# Altium footprint library CPU_STM_080816.PcbLib: 220 footprints (part 7 of 16)
Each footprint in its own frame and in the unit in brackets; x right, y up, seen from the top. Pads: shape width x height; smd on the part's side, far side on the other; paste and mask are expansions set on the pad; w line width, h text height; cw(c..) or ccw(c..) is an arc to the next point about the centre after c.
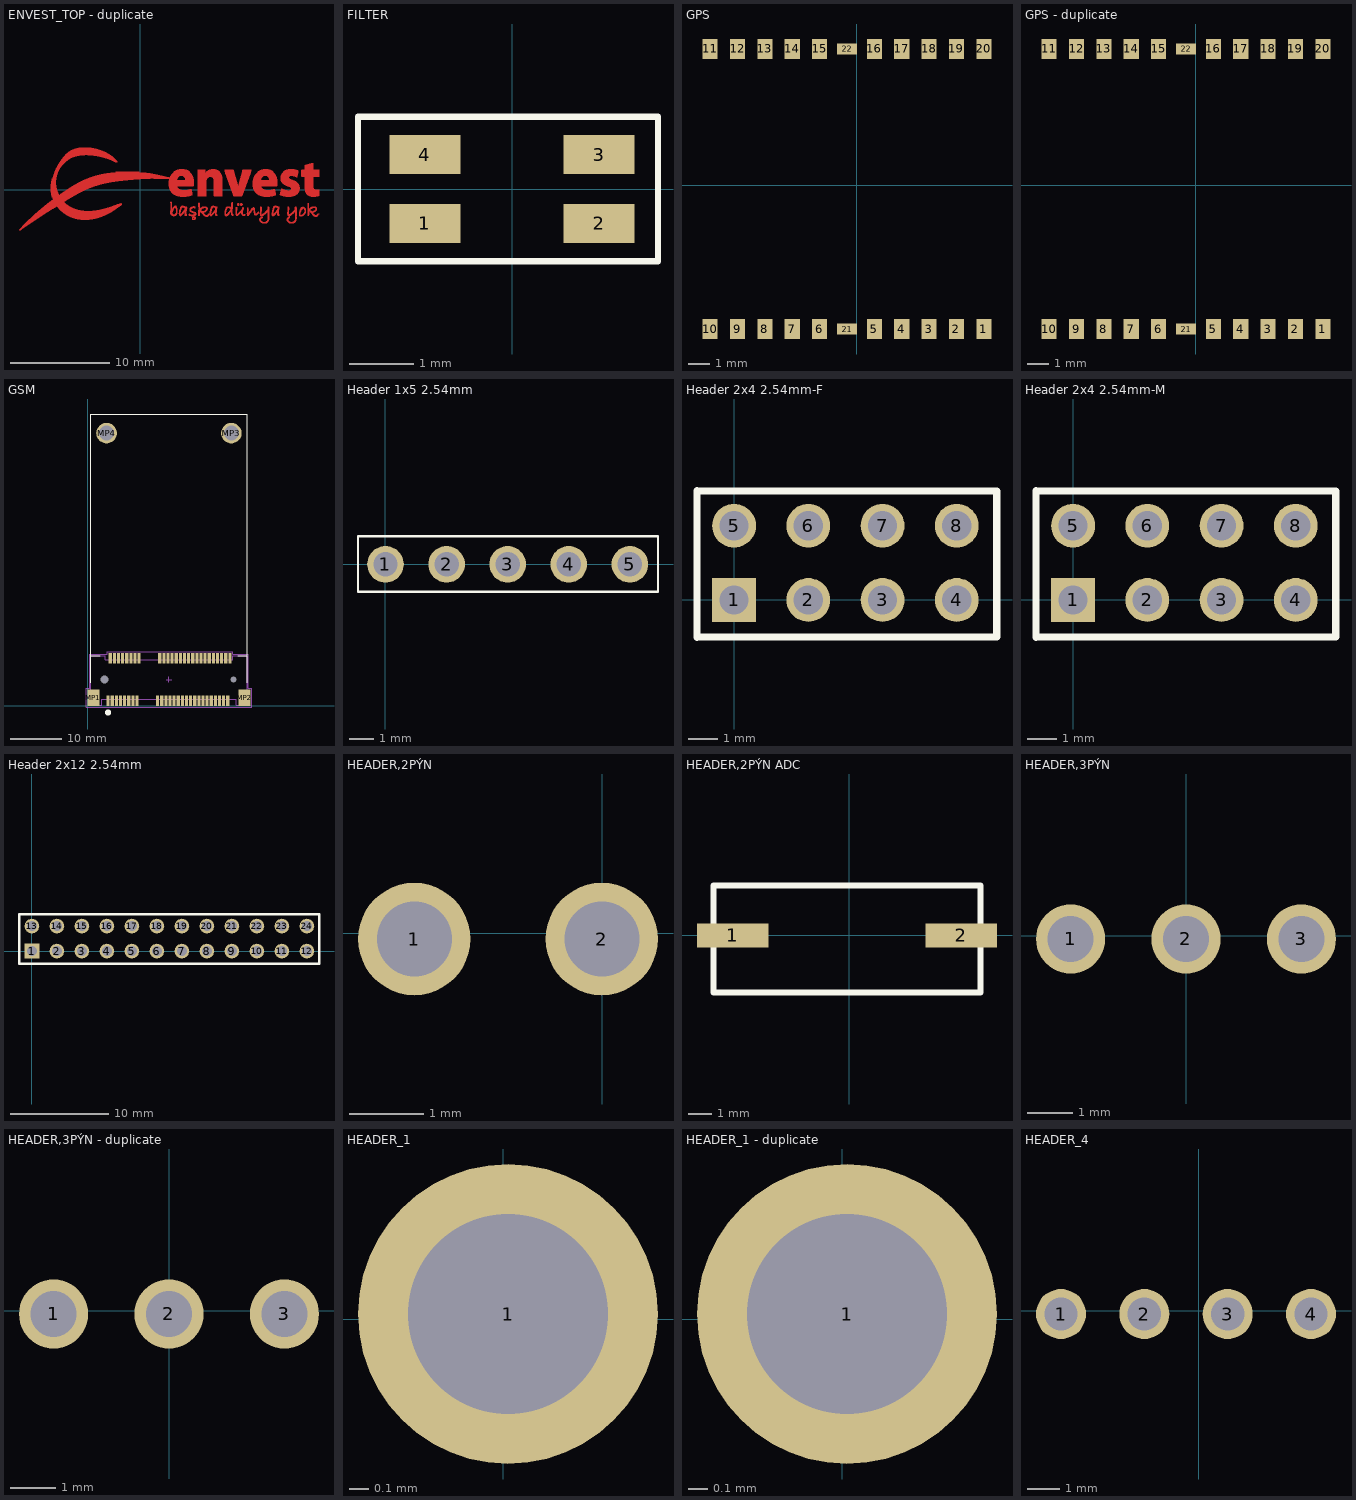
[diagram p6: the footprints below, top view; thin cyan lines are the x and y axes]

## ENVEST_TOP - duplicate [mm]
Top Layer:
  lines w0.051: -12.193,-4.029 -12.041,-4.029 ; -12.142,-3.978 -11.99,-3.978 ; -12.091,-3.928 -11.939,-3.928 ; -12.041,-3.877 -11.888,-3.877 ; -11.99,-3.826 -11.787,-3.826 ; -11.939,-3.775 -11.736,-3.775 ; -11.888,-3.724 -11.634,-3.724 ; -11.888,-3.674 -11.583,-3.674 ; -11.837,-3.623 -11.482,-3.623 ; -11.787,-3.572 -11.431,-3.572 ; -11.736,-3.521 -11.329,-3.521 ; -11.685,-3.47 -11.279,-3.47 ; -11.634,-3.42 -11.177,-3.42 ; -11.583,-3.369 -11.126,-3.369 ; -11.533,-3.318 -11.025,-3.318 ; -11.482,-3.267 -10.974,-3.267 ; -11.431,-3.216 -10.872,-3.216 ; -11.38,-3.166 -10.821,-3.166 ; -11.329,-3.115 -10.72,-3.115 ; -11.279,-3.064 -10.669,-3.064 ; -11.228,-3.013 -10.567,-3.013 ; -11.177,-2.962 -10.517,-2.962 ; -11.075,-2.912 -10.415,-2.912 ; -11.025,-2.861 -10.364,-2.861 ; -10.974,-2.81 -10.263,-2.81 ; -10.923,-2.759 -10.212,-2.759 ; -10.872,-2.708 -10.11,-2.708 ; -10.821,-2.658 -10.059,-2.658 ; -10.771,-2.607 -9.958,-2.607 ; -10.72,-2.556 -9.907,-2.556 ; -10.669,-2.505 -9.805,-2.505 ; -10.618,-2.454 -9.755,-2.454 ; -10.567,-2.404 -9.653,-2.404 ; -10.517,-2.353 -9.602,-2.353 ; -10.415,-2.302 -9.501,-2.302 ; -10.364,-2.251 -9.45,-2.251 ; -10.313,-2.2 -9.348,-2.2 ; -10.263,-2.15 -9.247,-2.15 ; -10.212,-2.099 -9.196,-2.099 ; -10.161,-2.048 -9.094,-2.048 ; -10.059,-1.997 -9.043,-1.997 ; -10.009,-1.946 -8.942,-1.946 ; -9.958,-1.896 -8.891,-1.896 ; -9.907,-1.845 -8.789,-1.845 ; -9.856,-1.794 -8.739,-1.794 ; -9.755,-1.743 -8.637,-1.743 ; -9.704,-1.692 -8.535,-1.692 ; -9.653,-1.642 -8.485,-1.642 ; -9.602,-1.591 -7.215,-1.591 ; -9.551,-1.54 -7.316,-1.54 ; -9.45,-1.489 -7.367,-1.489 ; -9.399,-1.438 -7.469,-1.438 ; -9.348,-1.388 -7.519,-1.388 ; -9.297,-1.337 -7.57,-1.337 ; -9.196,-1.286 -7.621,-1.286 ; -9.145,-1.235 -7.672,-1.235 ; -9.094,-1.184 -7.723,-1.184 ; -8.993,-1.134 -7.672,-1.134 ; -8.993,-0.168 -8.332,-0.168 ; -8.993,-0.118 -8.383,-0.118 ; -8.993,-0.067 -8.383,-0.067 ; -8.993,-0.016 -8.383,-0.016 ; -8.993,0.035 -8.434,0.035 ; -8.993,0.086 -8.434,0.086 ; -8.993,0.136 -8.434,0.136 ; -8.993,0.187 -8.434,0.187 ; -8.993,0.238 -8.485,0.238 ; -8.993,0.289 -8.485,0.289 ; -8.993,0.34 -8.485,0.34 ; -8.993,0.39 -8.485,0.39 ; -8.993,0.441 -8.485,0.441 ; -8.993,0.492 -8.485,0.492 ; -8.993,0.543 -8.535,0.543 ; -8.993,0.594 -8.535,0.594 ; -8.942,-1.083 -7.57,-1.083 ; -8.942,-0.473 -8.231,-0.473 ; -8.942,-0.422 -8.231,-0.422 ; -8.942,-0.372 -8.281,-0.372 ; -8.942,-0.321 -8.281,-0.321 ; -8.942,-0.27 -8.281,-0.27 ; -8.942,-0.219 -8.332,-0.219 ; -8.942,0.644 -8.535,0.644 ; -8.942,0.695 -8.535,0.695 ; -8.942,0.746 -8.535,0.746 ; -8.942,0.797 -8.535,0.797 ; -8.942,0.848 -8.535,0.848 ; -8.942,0.898 -8.535,0.898 ; -8.891,-1.032 -7.519,-1.032 ; -8.891,-0.676 -6.91,-0.676 ; -8.891,-0.626 -6.808,-0.626 ; -8.891,-0.575 -6.757,-0.575 ; -8.891,-0.524 -6.656,-0.524 ; -8.891,0.949 -8.535,0.949 ; -8.891,1 -8.535,1 ; -8.891,1.051 -8.535,1.051 ; -8.891,1.102 -8.485,1.102 ; -8.891,1.152 -8.485,1.152 ; -8.84,-0.981 -7.418,-0.981 ; -8.84,-0.829 -7.164,-0.829 ; -8.84,-0.778 -7.113,-0.778 ; -8.84,-0.727 -7.011,-0.727 ; -8.84,1.203 -8.485,1.203 ; -8.84,1.254 -8.485,1.254 ; -8.84,1.305 -8.485,1.305 ; -8.789,-0.93 -7.367,-0.93 ; -8.789,-0.88 -7.265,-0.88 ; -8.789,1.356 -8.485,1.356 ; -8.789,1.406 -8.434,1.406 ; -8.789,1.457 -8.434,1.457 ; -8.739,1.508 -8.434,1.508 ; -8.739,1.559 -8.434,1.559 ; -8.739,1.61 -8.383,1.61 ; -8.688,1.66 -8.383,1.66 ; -8.688,1.711 -8.383,1.711 ; -8.688,1.762 -8.332,1.762 ; -8.637,1.813 -8.332,1.813 ; -8.637,1.864 -8.281,1.864 ; -8.586,1.914 -8.281,1.914 ; -8.586,1.965 -8.231,1.965 ; -8.535,2.016 -8.231,2.016 ; -8.535,2.067 -8.18,2.067 ; -8.535,2.118 -8.18,2.118 ; -8.485,2.168 -8.129,2.168 ; -8.434,2.219 -8.129,2.219 ; -8.434,2.27 -8.078,2.27 ; -8.383,-1.642 -7.164,-1.642 ; -8.383,2.321 -8.027,2.321 ; -8.383,2.372 -7.977,2.372 ; -8.332,-1.692 -7.062,-1.692 ; -8.332,2.422 -7.977,2.422 ; -8.332,2.473 -7.926,2.473 ; -8.281,-1.743 -6.961,-1.743 ; -8.281,2.524 -7.875,2.524 ; -8.281,2.575 -7.824,2.575 ; -8.231,-1.845 -6.757,-1.845 ; -8.231,-1.794 -6.859,-1.794 ; -8.231,2.626 -7.773,2.626 ; -8.18,-1.896 -6.605,-1.896 ; -8.18,2.676 -7.723,2.676 ; -8.18,2.727 -7.672,2.727 ; -8.129,-1.946 -6.453,-1.946 ; -8.129,-0.473 -6.554,-0.473 ; -8.129,2.778 -7.621,2.778 ; -8.078,-1.997 -6.3,-1.997 ; -8.078,-0.422 -6.453,-0.422 ; -8.078,2.829 -7.57,2.829 ; -8.078,2.88 -7.519,2.88 ; -8.027,-2.048 -6.046,-2.048 ; -8.027,-0.372 -6.402,-0.372 ; -8.027,2.93 -7.469,2.93 ; -7.977,-2.099 -5.691,-2.099 ; -7.977,2.981 -7.367,2.981 ; -7.977,3.032 -7.316,3.032 ; -7.926,-0.321 -6.3,-0.321 ; -7.926,3.083 -7.265,3.083 ; -7.875,-2.15 -2.846,-2.15 ; -7.875,-0.27 -6.199,-0.27 ; -7.875,3.134 -7.164,3.134 ; -7.824,-2.2 -2.897,-2.2 ; -7.824,3.184 -7.113,3.184 ; -7.824,3.235 -7.011,3.235 ; -7.773,-2.251 -2.998,-2.251 ; -7.773,-0.219 -6.097,-0.219 ; -7.773,3.286 -6.91,3.286 ; -7.723,-2.302 -3.1,-2.302 ; -7.723,-0.168 -5.995,-0.168 ; -7.723,3.337 -6.757,3.337 ; -7.672,3.388 -6.605,3.388 ; -7.621,-2.353 -3.201,-2.353 ; -7.621,-0.118 -5.894,-0.118 ; -7.621,3.438 -6.402,3.438 ; -7.57,-2.404 -3.303,-2.404 ; -7.57,-0.067 -5.792,-0.067 ; -7.57,3.489 -6.148,3.489 ; -7.57,3.54 -5.589,3.54 ; -7.519,3.591 -3.1,3.591 ; -7.469,-2.454 -3.405,-2.454 ; -7.469,-0.016 -5.691,-0.016 ; -7.469,3.642 -3.201,3.642 ; -7.418,-2.505 -3.506,-2.505 ; -7.418,0.035 -5.589,0.035 ; -7.367,3.692 -3.303,3.692 ; -7.316,-2.556 -3.608,-2.556 ; -7.316,0.086 -5.487,0.086 ; -7.316,3.743 -3.354,3.743 ; -7.265,0.136 -5.335,0.136 ; -7.265,3.794 -3.455,3.794 ; -7.215,-2.607 -3.76,-2.607 ; -7.215,3.845 -3.557,3.845 ; -7.164,0.187 -5.233,0.187 ; -7.113,-2.658 -3.862,-2.658 ; -7.113,0.238 -5.132,0.238 ; -7.113,3.896 -3.709,3.896 ; -7.062,3.946 -3.811,3.946 ; -7.011,-2.708 -4.014,-2.708 ; -7.011,0.289 -4.979,0.289 ; -6.961,0.34 -4.827,0.34 ; -6.961,3.997 -3.963,3.997 ; -6.859,-2.759 -4.167,-2.759 ; -6.859,0.39 -4.725,0.39 ; -6.859,4.048 -4.116,4.048 ; -6.757,0.441 -4.573,0.441 ; -6.707,-2.81 -4.319,-2.81 ; -6.707,0.492 -4.37,0.492 ; -6.707,4.099 -4.268,4.099 ; -6.605,0.543 -4.217,0.543 ; -6.605,4.15 -4.421,4.15 ; -6.554,-2.861 -4.522,-2.861 ; -6.503,0.594 -4.065,0.594 ; -6.402,0.644 -3.862,0.644 ; -6.402,4.2 -4.675,4.2 ; -6.351,-2.912 -4.776,-2.912 ; -6.351,0.695 -3.659,0.695 ; -6.249,0.746 -3.405,0.746 ; -6.199,4.251 -4.929,4.251 ; -6.148,0.797 -3.151,0.797 ; -6.046,0.848 -2.897,0.848 ; -5.995,-2.962 -5.132,-2.962 ; -5.945,0.898 -2.541,0.898 ; -5.843,0.949 -2.185,0.949 ; -5.741,1 -1.779,1 ; -5.64,1.051 -1.271,1.051 ; -5.487,1.102 -0.712,1.102 ; -5.386,1.152 -0.001,1.152 ; -5.284,3.54 -3.049,3.54 ; -5.233,1.203 1.015,1.203 ; -5.132,1.254 2.945,1.254 ; -4.979,1.305 2.895,1.305 ; -4.827,1.356 2.641,1.356 ; -4.776,-2.099 -2.744,-2.099 ; -4.675,1.406 2.437,1.406 ; -4.675,3.489 -2.947,3.489 ; -4.522,1.457 2.234,1.457 ; -4.37,-2.048 -2.693,-2.048 ; -4.319,1.508 1.98,1.508 ; -4.319,3.438 -2.897,3.438 ; -4.116,1.559 1.777,1.559 ; -4.065,-1.997 -2.592,-1.997 ; -4.065,3.388 -2.795,3.388 ; -3.913,1.61 1.523,1.61 ; -3.862,-1.946 -2.541,-1.946 ; -3.862,3.337 -2.744,3.337 ; -3.659,-1.896 -2.439,-1.896 ; -3.659,1.66 1.269,1.66 ; -3.659,3.286 -2.693,3.286 ; -3.506,3.235 -2.643,3.235 ; -3.455,-1.845 -2.389,-1.845 ; -3.354,1.711 1.015,1.711 ; -3.303,-1.794 -2.338,-1.794 ; -3.303,3.184 -2.592,3.184 ; -3.151,3.134 -2.541,3.134 ; -3.1,-1.743 -2.236,-1.743 ; -3.049,3.083 -2.49,3.083 ; -2.947,-1.692 -2.185,-1.692 ; -2.947,1.762 0.609,1.762 ; -2.897,3.032 -2.439,3.032 ; -2.795,-1.642 -2.135,-1.642 ; -2.795,2.981 -2.389,2.981 ; -2.693,-1.591 -2.084,-1.591 ; -2.693,2.93 -2.338,2.93 ; -2.592,2.88 -2.287,2.88 ; -2.541,-1.54 -1.982,-1.54 ; -2.49,2.829 -2.287,2.829 ; -2.439,1.813 -0.103,1.813 ; -2.389,-1.489 -1.931,-1.489 ; -2.287,-1.438 -1.881,-1.438 ; -2.135,-1.388 -1.881,-1.388 ; -1.982,-1.337 -1.931,-1.337 ; 1.371,1.203 2.895,1.203 ; 2.895,0.441 5.333,0.441 ; 2.895,0.492 5.384,0.492 ; 2.895,0.543 5.384,0.543 ; 2.895,0.594 5.384,0.594 ; 2.895,0.644 5.384,0.644 ; 2.895,0.695 5.384,0.695 ; 2.895,0.746 5.384,0.746 ; 2.895,0.797 5.384,0.797 ; 2.895,0.848 5.384,0.848 ; 2.895,0.898 5.384,0.898 ; 2.895,0.949 5.384,0.949 ; 2.945,0.238 3.809,0.238 ; 2.945,0.289 3.758,0.289 ; 2.945,0.34 3.758,0.34 ; 2.945,0.39 3.707,0.39 ; 2.945,1 5.384,1 ; 2.945,1.051 3.707,1.051 ; 2.945,1.102 3.707,1.102 ; 2.945,1.152 3.758,1.152 ; 2.996,0.086 4.012,0.086 ; 2.996,0.136 3.911,0.136 ; 2.996,0.187 3.86,0.187 ; 2.996,1.203 3.758,1.203 ; 2.996,1.254 3.809,1.254 ; 2.996,1.305 3.809,1.305 ; 3.047,-2.353 3.25,-2.353 ; 3.047,-2.302 3.25,-2.302 ; 3.047,-2.251 3.25,-2.251 ; 3.047,-2.2 3.25,-2.2 ; 3.047,-2.15 3.301,-2.15 ; 3.047,-2.099 3.301,-2.099 ; 3.047,-1.235 3.199,-1.235 ; 3.047,-0.016 5.181,-0.016 ; 3.047,0.035 4.165,0.035 ; 3.047,1.356 3.86,1.356 ; 3.047,1.406 3.911,1.406 ; 3.098,-2.454 3.352,-2.454 ; 3.098,-2.404 3.301,-2.404 ; 3.098,-2.048 3.352,-2.048 ; 3.098,-1.997 3.199,-1.997 ; 3.098,-1.946 3.199,-1.946 ; 3.098,-1.896 3.199,-1.896 ; 3.098,-1.845 3.199,-1.845 ; 3.098,-1.794 3.199,-1.794 ; 3.098,-1.743 3.199,-1.743 ; 3.098,-1.692 3.199,-1.692 ; 3.098,-1.642 3.199,-1.642 ; 3.098,-1.591 3.199,-1.591 ; 3.098,-1.54 3.199,-1.54 ; 3.098,-1.489 3.199,-1.489 ; 3.098,-1.438 3.199,-1.438 ; 3.098,-1.388 3.199,-1.388 ; 3.098,-1.337 3.199,-1.337 ; 3.098,-1.286 3.199,-1.286 ; 3.098,-1.184 3.149,-1.184 ; 3.098,-0.067 5.181,-0.067 ; 3.098,1.457 3.961,1.457 ; 3.149,-0.168 5.181,-0.168 ; 3.149,-0.118 5.181,-0.118 ; 3.149,1.508 5.231,1.508 ; 3.149,1.559 5.181,1.559 ; 3.199,-2.556 3.606,-2.556 ; 3.199,-2.505 3.657,-2.505 ; 3.199,-0.219 5.231,-0.219 ; 3.199,1.61 5.181,1.61 ; 3.25,-1.997 3.352,-1.997 ; 3.25,-1.946 3.352,-1.946 ; 3.25,-1.896 3.403,-1.896 ; 3.25,-0.27 5.231,-0.27 ; 3.25,1.66 5.13,1.66 ; 3.301,-1.845 3.403,-1.845 ; 3.301,-1.794 3.453,-1.794 ; 3.301,-0.321 5.231,-0.321 ; 3.301,1.711 5.079,1.711 ; 3.352,-2.607 3.453,-2.607 ; 3.352,-1.743 3.504,-1.743 ; 3.352,-0.372 5.231,-0.372 ; 3.352,1.762 5.028,1.762 ; 3.403,-1.692 3.707,-1.692 ; 3.403,1.813 4.977,1.813 ; 3.453,-1.642 3.657,-1.642 ; 3.453,-0.422 5.231,-0.422 ; 3.453,1.864 4.927,1.864 ; 3.504,-2.454 3.707,-2.454 ; 3.504,-1.591 3.657,-1.591 ; 3.555,-2.404 3.707,-2.404 ; 3.555,-1.743 3.707,-1.743 ; 3.555,-0.473 5.231,-0.473 ; 3.555,1.914 4.876,1.914 ; 3.606,-2.353 3.758,-2.353 ; 3.606,-1.845 3.758,-1.845 ; 3.606,-1.794 3.707,-1.794 ; 3.657,-2.302 3.758,-2.302 ; 3.657,-2.251 3.758,-2.251 ; 3.657,-2.2 3.758,-2.2 ; 3.657,-2.15 3.758,-2.15 ; 3.657,-2.099 3.758,-2.099 ; 3.657,-2.048 3.758,-2.048 ; 3.657,-1.997 3.758,-1.997 ; 3.657,-1.946 3.758,-1.946 ; 3.657,-1.896 3.758,-1.896 ; 3.657,-0.524 5.079,-0.524 ; 3.657,1.965 4.774,1.965 ; 3.758,2.016 4.673,2.016 ; 3.809,-0.575 4.927,-0.575 ; 3.911,-2.353 4.063,-2.353 ; 3.961,-2.505 4.215,-2.505 ; 3.961,-2.454 4.266,-2.454 ; 3.961,-2.404 4.063,-2.404 ; 3.961,-2.302 4.063,-2.302 ; 3.961,-2.251 4.063,-2.251 ; 3.961,-2.2 4.063,-2.2 ; 3.961,-2.15 4.114,-2.15 ; 3.961,-2.099 4.114,-2.099 ; 3.961,-2.048 4.114,-2.048 ; 3.961,2.067 4.469,2.067 ; 4.012,-2.556 4.165,-2.556 ; 4.012,-1.997 4.114,-1.997 ; 4.012,-1.946 4.165,-1.946 ; 4.063,-2.607 4.114,-2.607 ; 4.063,-1.896 4.165,-1.896 ; 4.063,-1.845 4.165,-1.845 ; 4.063,-1.794 4.215,-1.794 ; 4.063,-1.743 4.266,-1.743 ; 4.063,-0.626 4.622,-0.626 ; 4.114,-1.692 4.673,-1.692 ; 4.165,-2.404 4.317,-2.404 ; 4.165,-1.642 4.52,-1.642 ; 4.215,-2.353 4.368,-2.353 ; 4.215,-1.591 4.368,-1.591 ; 4.266,-2.302 4.419,-2.302 ; 4.266,-2.251 4.419,-2.251 ; 4.317,-2.2 4.469,-2.2 ; 4.368,-2.15 4.622,-2.15 ; 4.368,1.457 5.231,1.457 ; 4.419,-2.099 4.622,-2.099 ; 4.419,-2.048 4.673,-2.048 ; 4.419,-1.743 4.673,-1.743 ; 4.419,1.406 5.282,1.406 ; 4.469,-1.997 4.673,-1.997 ; 4.469,1.356 5.282,1.356 ; 4.52,-2.556 4.673,-2.556 ; 4.52,-2.505 4.673,-2.505 ; 4.52,-2.454 4.673,-2.454 ; 4.52,-2.404 4.622,-2.404 ; 4.52,-2.353 4.622,-2.353 ; 4.52,-2.302 4.622,-2.302 ; 4.52,-2.251 4.622,-2.251 ; 4.52,-2.2 4.622,-2.2 ; 4.52,-1.946 4.673,-1.946 ; 4.52,-1.896 4.673,-1.896 ; 4.52,-1.794 4.723,-1.794 ; 4.52,1.305 5.333,1.305 ; 4.571,-1.845 4.673,-1.845 ; 4.571,1.051 5.384,1.051 ; 4.571,1.102 5.384,1.102 ; 4.571,1.152 5.333,1.152 ; 4.571,1.203 5.333,1.203 ; 4.571,1.254 5.333,1.254 ; 4.774,0.035 5.181,0.035 ; 4.876,-2.505 5.587,-2.505 ; 4.876,-2.454 5.028,-2.454 ; 4.927,-2.556 5.536,-2.556 ; 4.927,-2.404 4.977,-2.404 ; 4.977,-2.099 5.181,-2.099 ; 4.977,-2.048 5.079,-2.048 ; 4.977,-1.997 5.079,-1.997 ; 4.977,-1.946 5.079,-1.946 ; 4.977,-1.896 5.13,-1.896 ; 4.977,-1.845 5.181,-1.845 ; 4.977,0.086 5.13,0.086 ; 5.028,-2.15 5.282,-2.15 ; 5.028,-1.794 5.282,-1.794 ; 5.079,-1.743 5.536,-1.743 ; 5.13,-2.607 5.181,-2.607 ; 5.13,-2.2 5.435,-2.2 ; 5.181,-1.692 5.536,-1.692 ; 5.231,-2.962 5.485,-2.962 ; 5.231,-2.912 5.587,-2.912 ; 5.231,-2.81 5.282,-2.81 ; 5.231,-2.759 5.587,-2.759 ; 5.231,-2.708 5.536,-2.708 ; 5.231,-2.251 5.587,-2.251 ; 5.282,-2.658 5.435,-2.658 ; 5.282,-2.607 5.384,-2.607 ; 5.333,-2.302 5.587,-2.302 ; 5.333,-1.642 5.435,-1.642 ; 5.384,-2.454 5.638,-2.454 ; 5.435,-2.861 5.587,-2.861 ; 5.435,-1.794 5.536,-1.794 ; 5.485,-2.81 5.587,-2.81 ; 5.485,-2.353 5.638,-2.353 ; 5.536,-2.404 5.638,-2.404 ; 5.79,-0.575 6.654,-0.575 ; 5.79,-0.524 6.654,-0.524 ; 5.79,-0.473 6.654,-0.473 ; 5.79,-0.422 6.654,-0.422 ; 5.79,-0.372 6.654,-0.372 ; 5.79,-0.321 6.654,-0.321 ; 5.79,-0.27 6.654,-0.27 ; 5.79,-0.219 6.654,-0.219 ; 5.79,-0.168 6.654,-0.168 ; 5.79,-0.118 6.654,-0.118 ; 5.79,-0.067 6.654,-0.067 ; 5.79,-0.016 6.654,-0.016 ; 5.79,0.035 6.654,0.035 ; 5.79,0.086 6.654,0.086 ; 5.79,0.136 6.654,0.136 ; 5.79,0.187 6.654,0.187 ; 5.79,0.238 6.654,0.238 ; 5.79,0.289 6.654,0.289 ; 5.79,0.34 6.654,0.34 ; 5.79,0.39 6.654,0.39 ; 5.79,0.441 6.654,0.441 ; 5.79,0.492 6.654,0.492 ; 5.79,0.543 6.654,0.543 ; 5.79,0.594 6.654,0.594 ; 5.79,0.644 6.654,0.644 ; 5.79,0.695 6.654,0.695 ; 5.79,0.746 6.654,0.746 ; 5.79,0.797 6.654,0.797 ; 5.79,0.848 6.654,0.848 ; 5.79,0.898 6.654,0.898 ; 5.79,0.949 6.654,0.949 ; 5.79,1 6.654,1 ; 5.79,1.051 6.654,1.051 ; 5.79,1.102 6.705,1.102 ; 5.79,1.152 6.705,1.152 ; 5.79,1.203 6.755,1.203 ; 5.79,1.254 6.755,1.254 ; 5.79,1.305 6.857,1.305 ; 5.79,1.356 6.908,1.356 ; 5.79,1.406 8.229,1.406 ; 5.79,1.457 8.229,1.457 ; 5.79,1.508 8.229,1.508 ; 5.79,1.559 8.178,1.559 ; 5.79,1.61 8.178,1.61 ; 5.79,1.66 8.127,1.66 ; 5.79,1.711 8.127,1.711 ; 5.79,1.762 6.552,1.762 ; 5.79,1.813 6.552,1.813 ; 5.79,1.864 6.552,1.864 ; 5.79,1.914 6.552,1.914 ; 5.79,1.965 6.552,1.965 ; 5.79,2.016 6.552,2.016 ; 5.841,-2.556 5.993,-2.556 ; 5.841,-2.505 5.993,-2.505 ; 5.841,-2.454 5.993,-2.454 ; 5.841,-2.404 5.993,-2.404 ; 5.841,-2.353 5.993,-2.353 ; 5.841,-2.302 5.993,-2.302 ; 5.841,-2.251 5.993,-2.251 ; 5.841,-2.2 6.044,-2.2 ; 5.841,-2.15 6.044,-2.15 ; 5.841,-2.099 6.044,-2.099 ; 5.841,-2.048 6.095,-2.048 ; 5.841,-1.642 5.993,-1.642 ; 5.841,-1.591 5.993,-1.591 ; 5.841,-1.54 5.993,-1.54 ; 5.841,-1.489 5.993,-1.489 ; 5.841,-1.438 5.993,-1.438 ; 5.841,-1.388 5.993,-1.388 ; 5.841,-1.337 5.993,-1.337 ; 5.892,-1.997 6.095,-1.997 ; 5.892,-1.946 6.146,-1.946 ; 5.892,-1.896 5.993,-1.896 ; 5.892,-1.845 5.993,-1.845 ; 5.892,-1.794 5.993,-1.794 ; 5.892,-1.743 5.993,-1.743 ; 5.892,-1.692 5.993,-1.692 ; 5.892,-1.286 5.943,-1.286 ; 6.044,-1.896 6.197,-1.896 ; 6.044,-1.845 6.247,-1.845 ; 6.095,-2.2 6.552,-2.2 ; 6.095,-2.15 6.298,-2.15 ; 6.095,-2.099 6.197,-2.099 ; 6.095,-1.794 6.4,-1.794 ; 6.146,-2.251 6.4,-2.251 ; 6.197,-2.302 6.349,-2.302 ; 6.197,-1.743 6.755,-1.743 ; 6.247,-2.353 6.4,-2.353 ; 6.247,-1.692 6.654,-1.692 ; 6.298,-2.404 6.451,-2.404 ; 6.349,-2.505 6.552,-2.505 ; 6.349,-2.454 6.501,-2.454 ; 6.349,-2.15 6.603,-2.15 ; 6.451,-2.556 6.908,-2.556 ; 6.501,-2.607 6.857,-2.607 ; 6.501,-2.099 6.654,-2.099 ; 6.552,-2.048 6.705,-2.048 ; 6.603,-2.658 6.806,-2.658 ; 6.603,-1.997 6.755,-1.997 ; 6.603,-1.794 6.755,-1.794 ; 6.603,1.762 8.076,1.762 ; 6.654,-1.946 6.755,-1.946 ; 6.654,-1.896 6.806,-1.896 ; 6.654,-1.845 6.806,-1.845 ; 6.654,1.813 8.025,1.813 ; 6.705,1.864 7.975,1.864 ; 6.806,-2.505 6.908,-2.505 ; 6.806,-2.454 6.959,-2.454 ; 6.806,1.914 7.924,1.914 ; 6.857,-2.404 6.959,-2.404 ; 6.857,1.965 7.822,1.965 ; 6.959,2.016 7.721,2.016 ; 7.009,-2.505 7.263,-2.505 ; 7.009,-2.454 7.111,-2.454 ; 7.009,-2.404 7.111,-2.404 ; 7.009,-2.353 7.111,-2.353 ; 7.009,-2.302 7.111,-2.302 ; 7.009,-2.251 7.162,-2.251 ; 7.009,-2.2 7.162,-2.2 ; 7.009,-2.15 7.162,-2.15 ; 7.06,-2.556 7.213,-2.556 ; 7.06,-2.099 7.162,-2.099 ; 7.06,-2.048 7.213,-2.048 ; 7.06,-1.997 7.213,-1.997 ; 7.06,-1.946 7.213,-1.946 ; 7.111,-2.607 7.162,-2.607 ; 7.111,-1.896 7.213,-1.896 ; 7.111,-1.845 7.263,-1.845 ; 7.111,-1.794 7.263,-1.794 ; 7.162,-2.454 7.314,-2.454 ; 7.162,-1.743 7.314,-1.743 ; 7.162,-1.692 7.771,-1.692 ; 7.162,2.067 7.568,2.067 ; 7.213,-2.404 7.365,-2.404 ; 7.213,-1.642 7.568,-1.642 ; 7.213,1.356 8.279,1.356 ; 7.263,-2.353 7.416,-2.353 ; 7.314,-2.302 7.467,-2.302 ; 7.314,-1.591 7.416,-1.591 ; 7.314,1.305 8.279,1.305 ; 7.365,-2.251 7.517,-2.251 ; 7.365,1.203 8.279,1.203 ; 7.365,1.254 8.279,1.254 ; 7.416,-2.2 7.517,-2.2 ; 7.416,-2.15 7.721,-2.15 ; 7.416,-0.524 8.279,-0.524 ; 7.416,-0.473 8.279,-0.473 ; 7.416,-0.422 8.279,-0.422 ; 7.416,-0.372 8.279,-0.372 ; 7.416,-0.321 8.279,-0.321 ; 7.416,-0.27 8.279,-0.27 ; 7.416,-0.219 8.279,-0.219 ; 7.416,-0.168 8.279,-0.168 ; 7.416,-0.118 8.279,-0.118 ; 7.416,-0.067 8.279,-0.067 ; 7.416,-0.016 8.279,-0.016 ; 7.416,0.035 8.279,0.035 ; 7.416,0.086 8.279,0.086 ; 7.416,0.136 8.279,0.136 ; 7.416,0.187 8.279,0.187 ; 7.416,0.238 8.279,0.238 ; 7.416,0.289 8.279,0.289 ; 7.416,0.34 8.279,0.34 ; 7.416,0.39 8.279,0.39 ; 7.416,0.441 8.279,0.441 ; 7.416,0.492 8.279,0.492 ; 7.416,0.543 8.279,0.543 ; 7.416,0.594 8.279,0.594 ; 7.416,0.644 8.279,0.644 ; 7.416,0.695 8.279,0.695 ; 7.416,0.746 8.279,0.746 ; 7.416,0.797 8.279,0.797 ; 7.416,0.848 8.279,0.848 ; 7.416,0.898 8.279,0.898 ; 7.416,0.949 8.279,0.949 ; 7.416,1 8.279,1 ; 7.416,1.051 8.279,1.051 ; 7.416,1.102 8.279,1.102 ; 7.416,1.152 8.279,1.152 ; 7.467,-2.099 7.721,-2.099 ; 7.467,-0.575 8.279,-0.575 ; 7.517,-2.048 7.721,-2.048 ; 7.517,-1.743 7.771,-1.743 ; 7.568,-2.505 7.771,-2.505 ; 7.568,-2.454 7.721,-2.454 ; 7.568,-2.404 7.67,-2.404 ; 7.568,-2.353 7.67,-2.353 ; 7.568,-2.302 7.67,-2.302 ; 7.568,-2.251 7.67,-2.251 ; 7.568,-2.2 7.721,-2.2 ; 7.568,-1.997 7.721,-1.997 ; 7.568,-1.946 7.721,-1.946 ; 7.568,-1.896 7.721,-1.896 ; 7.568,-1.794 7.771,-1.794 ; 7.619,-2.556 7.771,-2.556 ; 7.619,-1.845 7.721,-1.845 ; 8.533,-2.505 8.889,-2.505 ; 8.533,-2.454 8.635,-2.454 ; 8.533,-2.404 8.635,-2.404 ; 8.533,-2.353 8.635,-2.353 ; 8.533,-2.302 8.635,-2.302 ; 8.533,-2.251 8.635,-2.251 ; 8.533,-2.2 8.635,-2.2 ; 8.533,-2.15 8.686,-2.15 ; 8.533,-2.099 8.686,-2.099 ; 8.533,1.864 9.448,1.864 ; 8.533,1.914 9.448,1.914 ; 8.533,1.965 9.448,1.965 ; 8.533,2.016 9.397,2.016 ; 8.584,-2.556 8.838,-2.556 ; 8.584,-2.048 8.686,-2.048 ; 8.584,-1.997 8.686,-1.997 ; 8.584,-1.946 8.737,-1.946 ; 8.584,1.711 9.499,1.711 ; 8.584,1.762 9.499,1.762 ; 8.584,1.813 9.499,1.813 ; 8.635,-2.607 8.737,-2.607 ; 8.635,-1.896 8.737,-1.896 ; 8.635,-1.845 8.787,-1.845 ; 8.635,-1.794 8.787,-1.794 ; 8.635,1.61 9.549,1.61 ; 8.635,1.66 9.549,1.66 ; 8.686,-2.454 8.94,-2.454 ; 8.686,-1.743 9.143,-1.743 ; 8.686,1.457 9.6,1.457 ; 8.686,1.508 9.549,1.508 ; 8.686,1.559 9.549,1.559 ; 8.737,-1.692 9.092,-1.692 ; 8.737,1.305 9.651,1.305 ; 8.737,1.356 9.6,1.356 ; 8.737,1.406 9.6,1.406 ; 8.787,-2.404 8.991,-2.404 ; 8.787,1.152 9.702,1.152 ; 8.787,1.203 9.651,1.203 ; 8.787,1.254 9.651,1.254 ; 8.838,-2.353 8.991,-2.353 ; 8.838,1.051 9.702,1.051 ; 8.838,1.102 9.702,1.102 ; 8.889,-2.302 9.041,-2.302 ; 8.889,-2.251 9.092,-2.251 ; 8.889,0.898 9.753,0.898 ; 8.889,0.949 9.753,0.949 ; 8.889,1 9.702,1 ; 8.94,0.746 9.803,0.746 ; 8.94,0.797 9.803,0.797 ; 8.94,0.848 9.753,0.848 ; 8.991,-2.2 9.092,-2.2 ; 8.991,-2.15 9.143,-2.15 ; 8.991,-1.794 9.346,-1.794 ; 8.991,0.594 9.854,0.594 ; 8.991,0.644 9.803,0.644 ; 8.991,0.695 9.803,0.695 ; 9.041,-2.099 9.295,-2.099 ; 9.041,0.492 9.854,0.492 ; 9.041,0.543 9.854,0.543 ; 9.092,-2.048 9.295,-2.048 ; 9.092,-1.997 9.295,-1.997 ; 9.092,-1.845 9.346,-1.845 ; 9.092,0.34 10.616,0.34 ; 9.092,0.39 9.854,0.39 ; 9.092,0.441 9.854,0.441 ; 9.143,-1.946 9.295,-1.946 ; 9.143,-1.896 9.295,-1.896 ; 9.143,0.187 10.565,0.187 ; 9.143,0.238 10.616,0.238 ; 9.143,0.289 10.616,0.289 